# Altium footprint library ACTION_Others.pcblib: 88 footprints (part 2 of 6)
Each footprint in its own frame and in the unit in brackets; x right, y up, seen from the top. Pads: shape width x height; smd on the part's side, far side on the other; paste and mask are expansions set on the pad; w line width, h text height; cw(c..) or ccw(c..) is an arc to the next point about the centre after c.
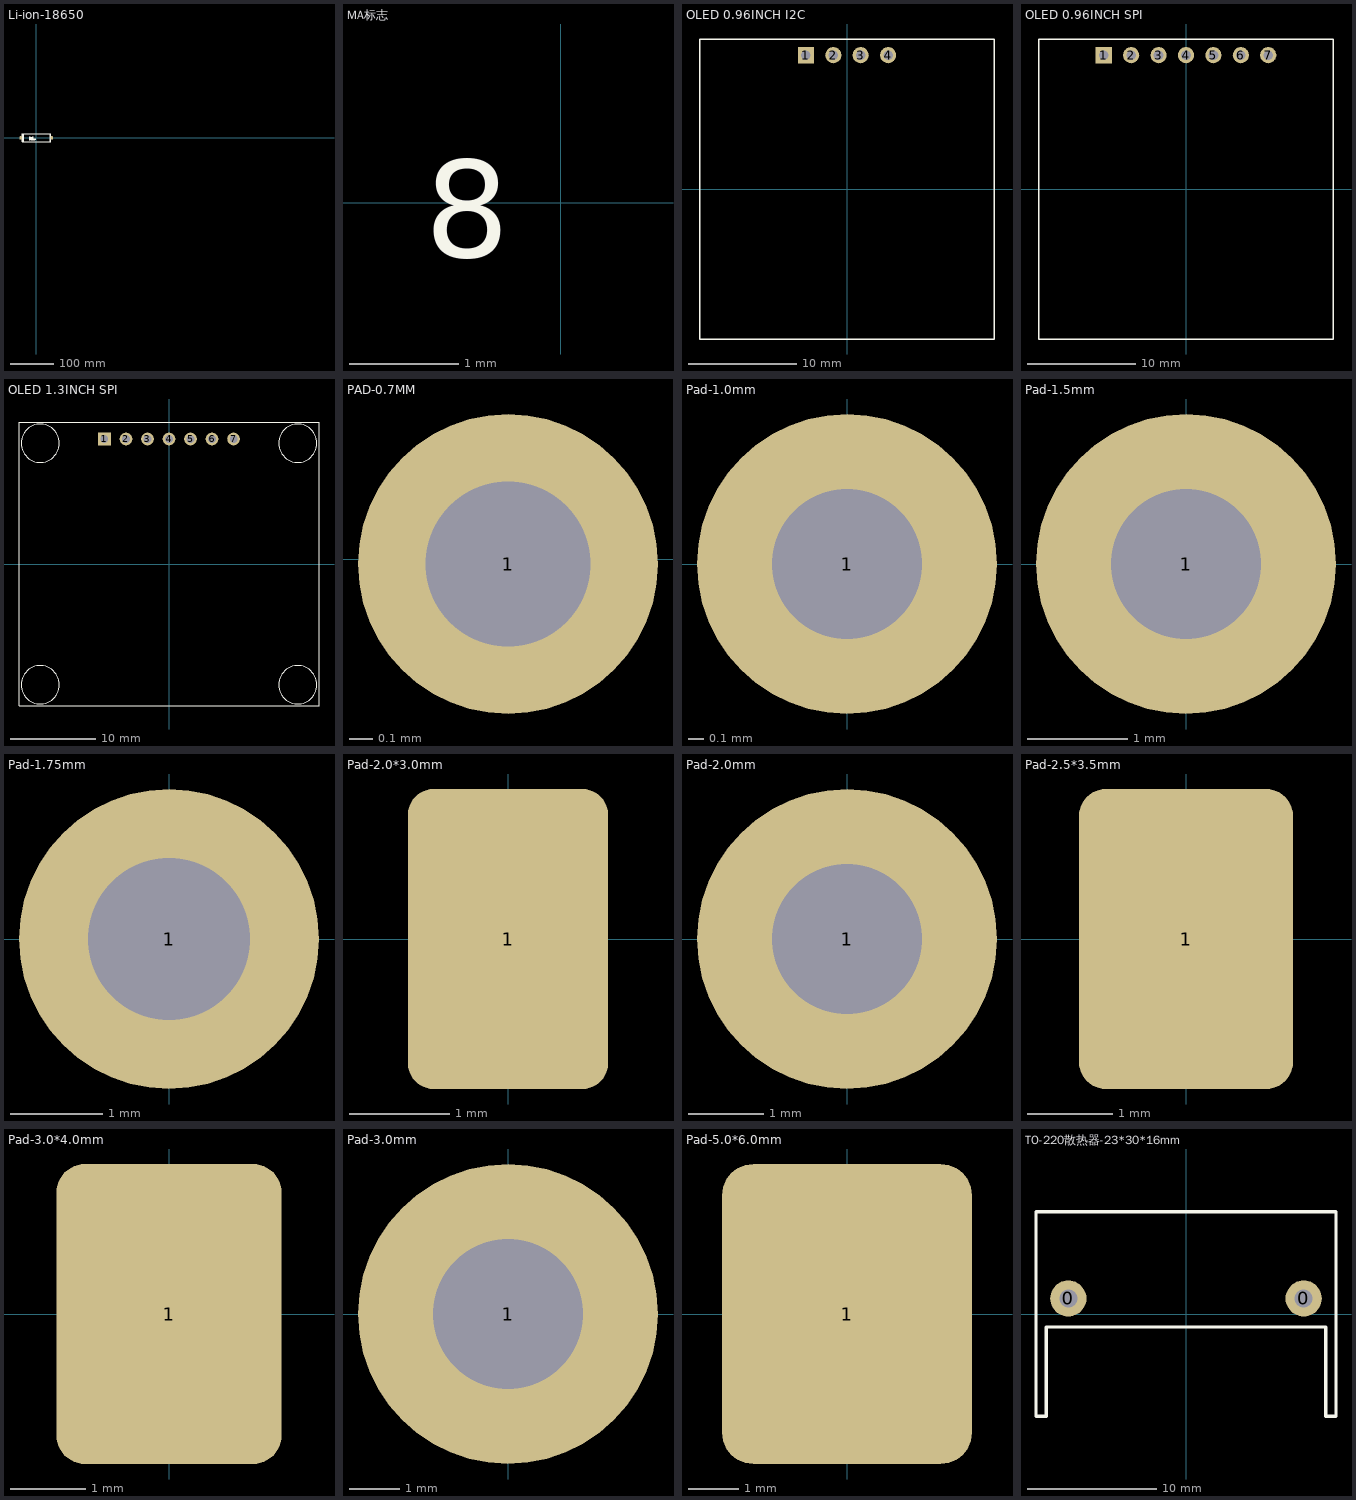
[diagram p1: the footprints below, top view; thin cyan lines are the x and y axes]

## Li-ion-18650 [mm]
pads (2):
  rrect50% 5x8 smd: 1(-35.5,0) 2(35.5,0)
Top Overlay:
  drawing of 1009 lines, arcs and shapes, not listed
3D body "User Library-18650-1.STEP": height 18.1, standoff 0.1, extent -32.5,-9 32.6,9

## MA标志 [mm]
Top Overlay:
  text "8" at -1.245,-0.787 h1.52

## OLED 0.96INCH I2C [mm]
pads (4):
  rect 1.5x1.5 hole 0.9: 1(-3.81,12.4)
  round 1.5 hole 0.9: 2(-1.27,12.4) 3(1.27,12.4) 4(3.81,12.4)
Top Overlay:
  lines w0.127: -13.65,-13.9 13.65,-13.9 13.65,13.9 -13.65,13.9 -13.65,-13.9
3D body "User Library-oled-1.STEP": height 2.7, standoff 0, extent -13.65,-13.9 13.65,13.9

## OLED 0.96INCH SPI [mm]
pads (7):
  rect 1.5x1.5 hole 0.9: 1(-7.62,12.4)
  round 1.5 hole 0.9: 2(-5.08,12.4) 3(-2.54,12.4) 4(0,12.4) 5(2.54,12.4) 6(5.08,12.4) 7(7.62,12.4)
Top Overlay:
  lines w0.127: -13.65,-13.9 -13.65,13.9 13.65,13.9 13.65,-13.9 -13.65,-13.9
3D body "User Library-oled-1.STEP": height 2.7, standoff 0, extent -13.65,-13.9 13.65,13.9

## OLED 1.3INCH SPI [mm]
pads (7):
  rect 1.5x1.5 hole 0.9: 1(-7.62,14.75)
  round 1.5 hole 0.9: 2(-5.08,14.75) 3(-2.54,14.75) 4(0,14.75) 5(2.54,14.75) 6(5.08,14.75) 7(7.62,14.75)
Top Overlay:
  circle w0.127: c-15.2,14.25 r2.25
  circle w0.127: c15.2,14.25 r2.25
  circle w0.127: c15.2,-14.25 r2.25
  circle w0.127: c-15.2,-14.25 r2.25
  lines w0.127: -17.7,-16.75 17.7,-16.75 17.7,16.75 -17.7,16.75 -17.7,-16.75
3D body: height 4, standoff 4, extent -17.704,-16.764 17.704,16.713

## PAD-0.7MM [mm]
pads (1):
  round 1.27 hole 0.7: 1(-3.217,-0.02)

## Pad-1.0mm [mm]
pads (1):
  round 2 hole 1: 1(0,0)

## Pad-1.5mm [mm]
pads (1):
  round 3 hole 1.5: 1(0,0)

## Pad-1.75mm [mm]
pads (1):
  round 3.25 hole 1.75: 1(0,0)

## Pad-2.0*3.0mm [mm]
pads (1):
  rrect25% 2x3 smd: 1(0,0)

## Pad-2.0mm [mm]
pads (1):
  round 4 hole 2: 1(0,0)

## Pad-2.5*3.5mm [mm]
pads (1):
  rrect25% 2.5x3.5 smd: 1(0,0)

## Pad-3.0*4.0mm [mm]
pads (1):
  rrect25% 3x4 smd: 1(0,0)

## Pad-3.0mm [mm]
pads (1):
  round 6 hole 3: 1(0,0)

## Pad-5.0*6.0mm [mm]
pads (1):
  rrect25% 5x6 smd: 1(0,0)

## TO-220散热器-23*30*16mm [mm]
pads (2):
  round 2.8 hole 1.4: 0(-9.1,1.2) 0(9.1,1.2)
Top Overlay:
  lines w0.254: -11.6,-7.9 -11.6,7.9 11.6,7.9 11.6,-7.9 10.8,-7.9 10.8,-1 -10.8,-1 -10.8,-7.9 -11.6,-7.9
3D body "零件1.STEP": height 30.1, standoff -2.9, extent -11.5,-7.9 11.5,7.85